# Altium footprint library DSO.PcbLib: 86 footprints (part 1 of 6)
Each footprint in its own frame and in the unit in brackets; x right, y up, seen from the top. Pads: shape width x height; smd on the part's side, far side on the other; paste and mask are expansions set on the pad; w line width, h text height; cw(c..) or ccw(c..) is an arc to the next point about the centre after c.
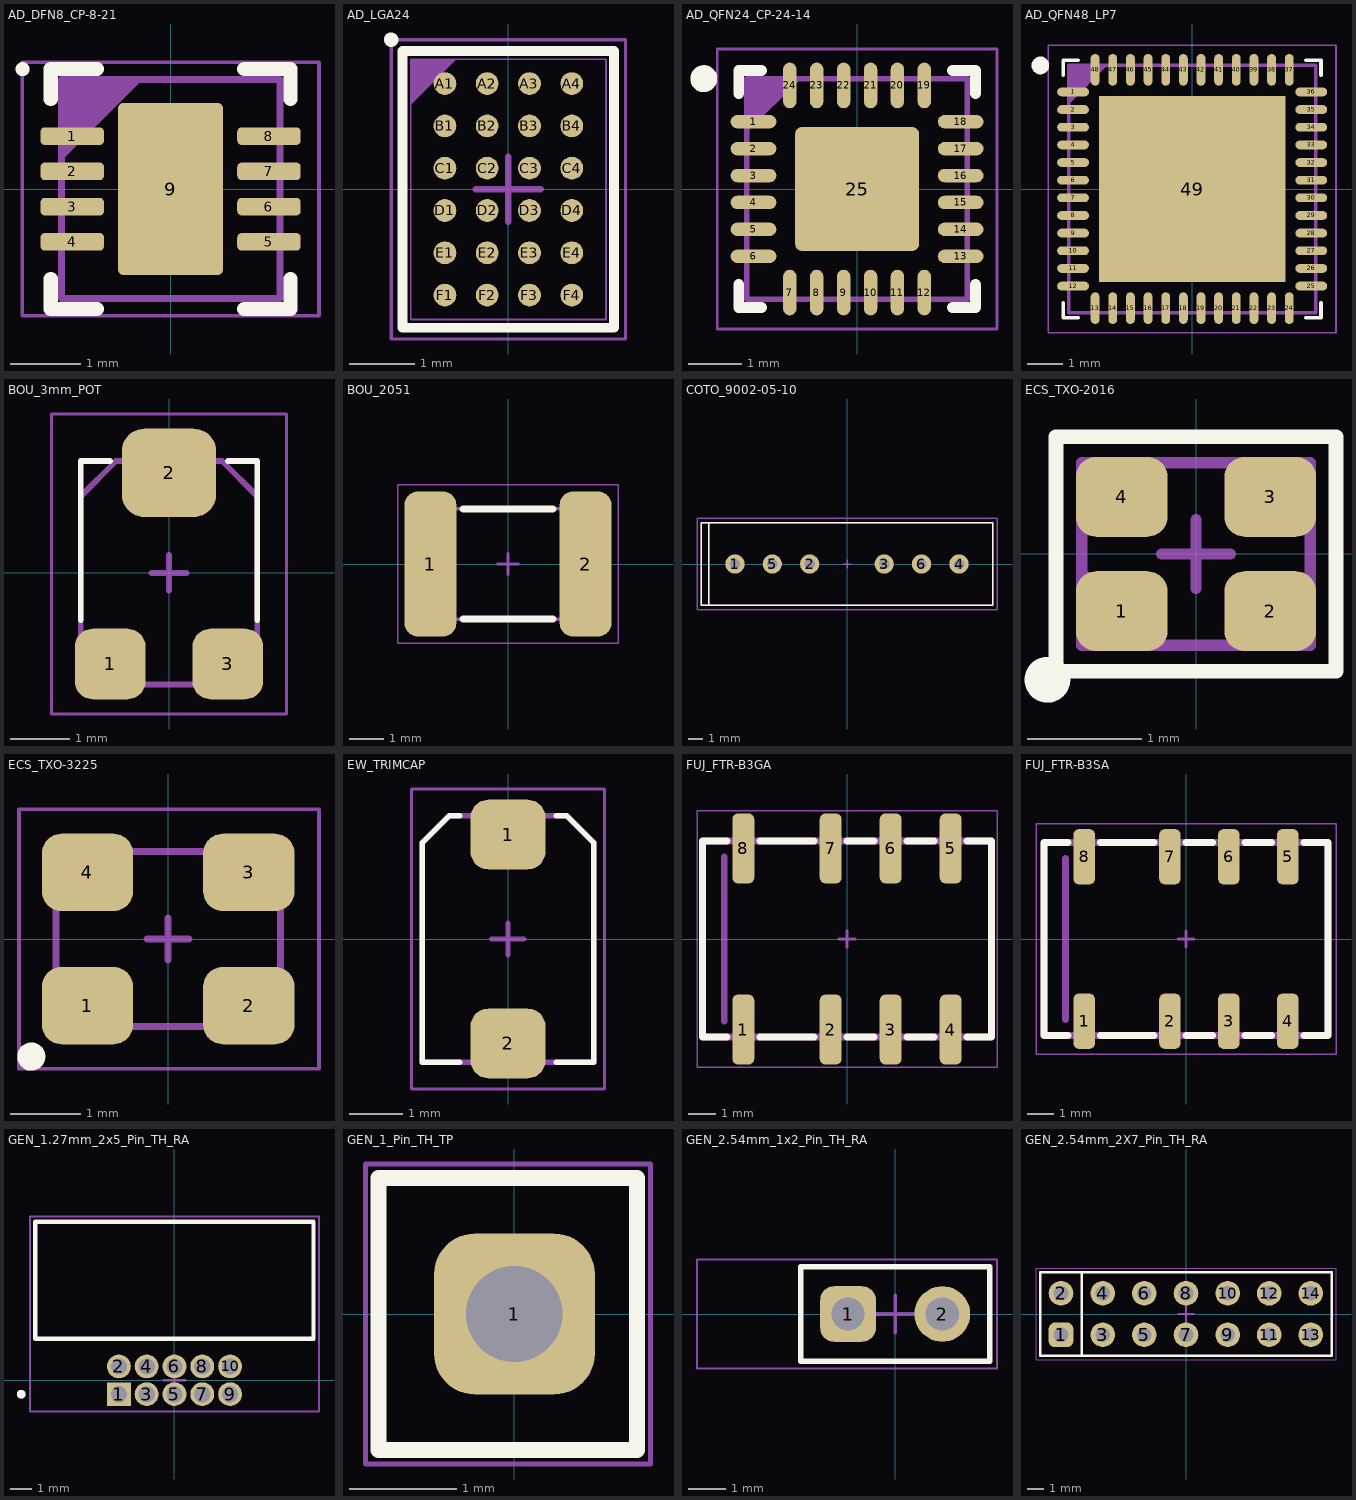
[diagram p0: the footprints below, top view; thin cyan lines are the x and y axes]

## AD_DFN8_CP-8-21 [mm] "SON, 8-Leads, Body 3.00x3.00mm, Pitch 0.50mm, Thermal Pad 2.44x1.49mm, IPC Medium Density"
height 0.8
pads (9):
  rrect50% 0.9x0.25 smd: 1(-1.395,0.75) 2(-1.395,0.25) 3(-1.395,-0.25) 4(-1.395,-0.75) 5(1.395,-0.75) 6(1.395,-0.25) 7(1.395,0.25) 8(1.395,0.75)
  rrect10% 1.49x2.44 smd paste-0.745: 9(0,0)
Top Overlay:
  circle w0.1: c-2.1,1.7 r0.05
  lines w0.2: -1.7,-1.275 -1.7,-1.7 -1.045,-1.7 ; -1.7,1.275 -1.7,1.7 -1.045,1.7 ; 1.045,-1.7 1.7,-1.7 1.7,-1.275 ; 1.045,1.7 1.7,1.7 1.7,1.275
Top Paste:
  rectangle: -0.7,-1.2 0.7,-0.1
  rectangle: -0.7,0.1 0.7,1.2
Top Courtyard:
  lines w0.05: -2.105,-1.8 2.105,-1.8 2.105,1.8 -2.105,1.8 -2.105,-1.8
Top Assembly:
  region: -1.55,0.4 -0.4,1.55 -1.55,1.55
  lines w0.1: -1.55,-1.55 1.55,-1.55 1.55,1.55 -1.55,1.55 -1.55,-1.55
  text ".Designator" at 0.209,-2.477 h1
Top Component Center:
  lines w0.1: -0.5,0 0.5,0 ; 0,-0.5 0,0.5
3D body "AD_DFN8_CP-8-21.step": height 0.8, standoff 0, extent -1.551,-1.55 1.551,1.55

## AD_LGA24 [mm]
pads (24):
  round 0.35 smd paste+0 mask+0: A1(-0.975,1.625) A2(-0.325,1.625) A3(0.325,1.625) A4(0.975,1.625) B1(-0.975,0.975) B2(-0.325,0.975) B3(0.325,0.975) B4(0.975,0.975) C1(-0.975,0.325) C2(-0.325,0.325) C3(0.325,0.325) C4(0.975,0.325) D1(-0.975,-0.325) D2(-0.325,-0.325) D3(0.325,-0.325) D4(0.975,-0.325) E1(-0.975,-0.975) E2(-0.325,-0.975) E3(0.325,-0.975) E4(0.975,-0.975) F1(-0.975,-1.625) F2(-0.325,-1.625) F3(0.325,-1.625) F4(0.975,-1.625)
Top Overlay:
  circle w0.2: c-1.8,2.3 r0.01
  lines w0.152: -1.627,-2.127 -1.627,2.127 1.627,2.127 1.627,-2.127 -1.627,-2.127
Top Courtyard:
  lines w0.05: -1.8,-2.3 1.8,-2.3 1.8,2.3 -1.8,2.3 -1.8,-2.3
Top Assembly:
  region: -1.5,1.3 -0.8,2 -1.5,2
  lines w0.025: -1.5,-2 -1.5,2 1.5,2 1.5,-2 -1.5,-2
  text ".Designator" at 0.209,-2.477 h1
Top Component Center:
  lines w0.1: -0.5,0 0.5,0 ; 0,-0.5 0,0.5
3D body: height 1.28, standoff 0, extent -1.513,-2.013 1.513,2.013

## AD_QFN24_CP-24-14 [mm] "QFN, 24-Leads, Body 4.00x4.00mm, Pitch 0.50mm, Thermal Pad 2.30x2.30mm, IPC Medium Density"
height 0.8
pads (25):
  oval 0.85x0.25 smd: 1(-1.925,1.25) 2(-1.925,0.75) 3(-1.925,0.25) 4(-1.925,-0.25) 5(-1.925,-0.75) 6(-1.925,-1.25) 13(1.925,-1.25) 14(1.925,-0.75) 15(1.925,-0.25) 16(1.925,0.25) 17(1.925,0.75) 18(1.925,1.25)
  oval 0.25x0.85 smd: 7(-1.25,-1.925) 8(-0.75,-1.925) 9(-0.25,-1.925) 10(0.25,-1.925) 11(0.75,-1.925) 12(1.25,-1.925) 19(1.25,1.925) 20(0.75,1.925) 21(0.25,1.925) 22(-0.25,1.925) 23(-0.75,1.925) 24(-1.25,1.925)
  rrect10% 2.3x2.3 smd paste-2.3: 25(0,0)
Top Overlay:
  circle w0.25: c-2.85,2.05 r0.125
  lines w0.2: -2.2,-1.775 -2.2,-2.2 -1.775,-2.2 ; -2.2,1.775 -2.2,2.2 -1.775,2.2 ; 1.775,-2.2 2.2,-2.2 2.2,-1.775 ; 1.775,2.2 2.2,2.2 2.2,1.775
Top Paste:
  rectangle: 0.1,-1.1 1.1,-0.1
  rectangle: -1.1,-1.1 -0.1,-0.1
  rectangle: -1.1,0.1 -0.1,1.1
  rectangle: 0.1,0.1 1.1,1.1
Top Courtyard:
  lines w0.05: -2.6,-2.6 -2.6,2.6 2.6,2.6 2.6,-2.6 -2.6,-2.6
Top Assembly:
  region: -2.05,1.05 -1.05,2.05 -2.05,2.05
  lines w0.1: -2.05,-2.05 2.05,-2.05 2.05,2.05 -2.05,2.05 -2.05,-2.05
  text ".Designator" at -2.477,-0.209 h1
Top Component Center:
  lines w0.1: -0.5,0 0.5,0 ; 0,-0.5 0,0.5
3D body "AD_QFN24_CP-24-14_1.step": height 0.8, standoff 0, extent -2.07,-2.07 2.07,2.07

## AD_QFN48_LP7 [mm] "QFN, 48-Leads, Body 7.00x7.00mm, Pitch 0.50mm, Thermal Pad 5.28x5.28mm, IPC Medium Density"
height 1
pads (49):
  oval 0.9x0.25 smd: 1(-3.375,2.75) 2(-3.375,2.25) 3(-3.375,1.75) 4(-3.375,1.25) 5(-3.375,0.75) 6(-3.375,0.25) 7(-3.375,-0.25) 8(-3.375,-0.75) 9(-3.375,-1.25) 10(-3.375,-1.75) 11(-3.375,-2.25) 12(-3.375,-2.75) 25(3.375,-2.75) 26(3.375,-2.25) 27(3.375,-1.75) 28(3.375,-1.25) 29(3.375,-0.75) 30(3.375,-0.25) 31(3.375,0.25) 32(3.375,0.75) 33(3.375,1.25) 34(3.375,1.75) 35(3.375,2.25) 36(3.375,2.75)
  oval 0.25x0.9 smd: 13(-2.75,-3.375) 14(-2.25,-3.375) 15(-1.75,-3.375) 16(-1.25,-3.375) 17(-0.75,-3.375) 18(-0.25,-3.375) 19(0.25,-3.375) 20(0.75,-3.375) 21(1.25,-3.375) 22(1.75,-3.375) 23(2.25,-3.375) 24(2.75,-3.375) 37(2.75,3.375) 38(2.25,3.375) 39(1.75,3.375) 40(1.25,3.375) 41(0.75,3.375) 42(0.25,3.375) 43(-0.25,3.375) 44(-0.75,3.375) 45(-1.25,3.375) 46(-1.75,3.375) 47(-2.25,3.375) 48(-2.75,3.375)
  rect 5.28x5.28 smd paste-5.28: 49(0,0)
Top Overlay:
  circle w0.25: c-4.3,3.5 r0.125
  lines w0.1: -3.65,-3.225 -3.65,-3.65 -3.225,-3.65 ; -3.65,3.225 -3.65,3.65 -3.225,3.65 ; 3.225,-3.65 3.65,-3.65 3.65,-3.225 ; 3.225,3.65 3.65,3.65 3.65,3.225
Top Paste:
  region: 2.575,-1.025 1.025,-1.025 1.025,-2.575 2.575,-2.575
  region: 0.775,-1.025 -0.775,-1.025 -0.775,-2.575 0.775,-2.575
  region: -1.025,-1.025 -2.575,-1.025 -2.575,-2.575 -1.025,-2.575
  region: -1.025,0.775 -2.575,0.775 -2.575,-0.775 -1.025,-0.775
  region: 0.775,0.775 -0.775,0.775 -0.775,-0.775 0.775,-0.775
  region: 2.575,0.775 1.025,0.775 1.025,-0.775 2.575,-0.775
  region: 2.575,2.575 1.025,2.575 1.025,1.025 2.575,1.025
  region: 0.775,2.575 -0.775,2.575 -0.775,1.025 0.775,1.025
  region: -1.025,2.575 -2.575,2.575 -2.575,1.025 -1.025,1.025
Top Courtyard:
  lines w0.05: -4.075,-4.075 -4.075,4.075 4.075,4.075 4.075,-4.075 -4.075,-4.075
Top Assembly:
  region: -3.5,2.4 -2.4,3.5 -3.5,3.5
  lines w0.1: -3.5,-3.5 3.5,-3.5 3.5,3.5 -3.5,3.5 -3.5,-3.5
  text ".Designator" at -2.477,-0.209 h1
Top Component Center:
  lines w0.1: -0.5,0 0.5,0 ; 0,-0.5 0,0.5
3D body "AD_QFN48_LP7.step": height 1, standoff 0, extent -3.501,-3.501 3.501,3.501

## BOU_3mm_POT [mm]
height 1.2
pads (3):
  rrect50% 1.2x1.2 smd: 1(-1,-1.55) 3(1,-1.55)
  rrect50% 1.6x1.5 smd: 2(0,1.7)
Top Overlay:
  lines w0.1: -1.5,-0.8 -1.5,1.9 -1,1.9 ; 1,1.9 1.5,1.9 1.5,-0.8
Top Courtyard:
  lines w0.05: -2,-2.4 -2,2.7 2,2.7 2,-2.4 -2,-2.4
Top Assembly:
  lines w0.1: -1.5,-1.9 1.5,-1.9 1.5,1.3 0.9,1.9 -0.9,1.9 -1.5,1.3 -1.5,-1.9
  text ".Designator" at 0.209,-2.477 h1
Top Component Center:
  lines w0.1: -0.3,0 0.3,0 ; 0,-0.3 0,0.3
3D body "TC-33X-2.stp": height 1.13, standoff -0.02, extent -1.8,-1.763 1.8,2.2

## BOU_2051 [mm]
height 3
pads (2):
  rrect50% 1.5x4.2 smd: 1(-2.25,0) 2(2.25,0)
Top Overlay:
  lines w0.2: -1.3,-1.6 1.3,-1.6 ; -1.3,1.6 1.3,1.6
Top Courtyard:
  lines w0.05: -3.2,-2.3 3.2,-2.3 3.2,2.3 -3.2,2.3 -3.2,-2.3
Top Assembly:
  lines w0.1: -2.3,-1.6 -2.3,1.6 2.3,1.6 2.3,-1.6 -2.3,-1.6
  text ".Designator" at -2.477,-0.209 h1
Top Component Center:
  lines w0.1: -0.3,0 0.3,0 ; 0,-0.3 0,0.3
3D body "2051-xx-sm.stp": height 2.7, standoff 0, extent -2.25,-1.6 2.25,1.6

## COTO_9002-05-10 [mm]
pads (6):
  round 1.31 hole 0.71: 1(-7.619,0) 2(-2.539,0) 3(2.528,0) 4(7.619,0) 5(-5.079,0) 6(5.064,0)
Top Overlay:
  lines w0.1: -9.398,-2.794 -9.398,2.794 ; 9.896,2.794 -9.906,2.794 -9.906,-2.794 9.896,-2.794 9.903,-2.787 9.903,2.801
Top Courtyard:
  lines w0.1: -10.2,-3.1 -10.2,3.1 10.2,3.1 10.2,-3.1 -10.2,-3.1
Top Assembly:
  lines w0.1: -9.398,-2.794 -9.398,2.794 ; 9.896,2.794 -9.906,2.794 -9.906,-2.794 9.896,-2.794 9.903,-2.787 9.903,2.801
  text ".Designator" at -2.477,-0.209 h1
Top Component Center:
  lines w0.1: -0.3,0 0.3,0 ; 0,-0.3 0,0.3
3D body "9002-A.stp": height 7.64, standoff -3.15, extent -9.5,-2.542 9.5,2.488

## ECS_TXO-2016 [mm]
height 0.8
pads (4):
  rrect50% 0.8x0.7 smd: 1(-0.65,-0.5) 2(0.65,-0.5) 3(0.65,0.5) 4(-0.65,0.5)
Top Overlay:
  circle w0.2: c-1.3,-1.1 r0.1
  lines w0.127: -1.225,-1.025 1.225,-1.025 1.225,1.025 -1.225,1.025 -1.225,-1.025
Top Courtyard:
  lines w0.05: -1.2,-1 1.2,-1 1.2,1 -1.2,1 -1.2,-1
Top Assembly:
  region: -0.3,-0.8 -1,-0.1 -1,-0.8
  lines w0.1: -1,-0.8 1,-0.8 1,0.8 -1,0.8 -1,-0.8
  text ".Designator" at -2.477,-0.209 h1
Top Component Center:
  lines w0.1: -0.3,0 0.3,0 ; 0,-0.3 0,0.3
3D body: height 0.8, standoff 0, extent -1.05,-0.85 1.05,0.85

## ECS_TXO-3225 [mm]
height 0.8
pads (4):
  rrect50% 1.3x1.1 smd: 1(-1.15,-0.95) 2(1.15,-0.95) 3(1.15,0.95) 4(-1.15,0.95)
Top Overlay:
  circle w0.2: c-1.95,-1.675 r0.1
Top Courtyard:
  lines w0.05: -2.125,-1.85 2.15,-1.85 2.15,1.85 -2.125,1.85 -2.125,-1.85
Top Assembly:
  region: -0.9,-1.25 -1.6,-0.55 -1.6,-1.25
  lines w0.1: -1.6,-1.25 -1.6,1.25 1.6,1.25 1.6,-1.25 -1.6,-1.25
  text ".Designator" at -2.477,-0.209 h1
Top Component Center:
  lines w0.1: -0.3,0 0.3,0 ; 0,-0.3 0,0.3
3D body: height 0.8, standoff 0, extent -1.6,-1.25 1.6,1.25

## EW_TRIMCAP [mm]
height 1.5
pads (2):
  rrect50% 1.4x1.3 smd: 1(0,1.95) 2(0,-1.95)
Top Overlay:
  lines w0.1: -0.9,-2.3 -1.6,-2.3 -1.6,1.6 -1.6,1.8 -1.1,2.3 -0.9,2.3 ; 0.9,-2.3 1.6,-2.3 1.6,1.8 1.1,2.3 0.9,2.3
Top Courtyard:
  lines w0.05: -1.8,-2.8 -1.8,2.8 1.8,2.8 1.8,-2.8 -1.8,-2.8
Top Assembly:
  lines w0.1: -1.6,-2.3 -1.6,1.6 -1.6,1.8 -1.1,2.3 0.9,2.3 1.1,2.3 1.6,1.8 1.6,-2.3 0.9,-2.3 -1.6,-2.3
  text ".Designator" at 0.209,-2.477 h1
Top Component Center:
  lines w0.1: -0.3,0 0.3,0 ; 0,-0.3 0,0.3
3D body: height 1.5, standoff 0, extent -1.6,-2.3 1.6,2.3

## FUJ_FTR-B3GA [mm]
height 5.45
pads (8):
  rrect50% 0.8x2.56 smd: 1(-3.8,-3.32) 2(-0.6,-3.32) 3(1.6,-3.32) 4(3.8,-3.32) 5(3.8,3.32) 6(1.6,3.32) 7(-0.6,3.32) 8(-3.8,3.32)
Top Overlay:
  lines w0.254: -4.4,-3.6 -5.3,-3.6 -5.3,3.6 -4.4,3.6 ; -3.2,-3.6 -1.2,-3.6 ; -3.2,3.6 -1.2,3.6 ; 0,-3.6 1,-3.6 ; 0,3.6 1,3.6 ; 2.2,-3.6 3.2,-3.6 ; 2.2,3.6 3.2,3.6 ; 4.4,-3.6 5.3,-3.6 5.3,3.6 4.4,3.6
Top Courtyard:
  lines w0.05: -5.5,-4.7 -5.5,4.7 5.5,4.7 5.5,-4.7 -5.5,-4.7
Top Assembly:
  lines w0.254: -4.5,-3 -4.5,3 ; -5.3,-3.6 -5.3,3.6 -3.2,3.6 0,3.6 2.2,3.6 4.4,3.6 5.3,3.6 5.3,-3.6 4.4,-3.6 2.2,-3.6 0,-3.6 -3.2,-3.6 -5.3,-3.6
  text ".Designator" at -2.477,-0.209 h1
Top Component Center:
  lines w0.1: -0.3,0 0.3,0 ; 0,-0.3 0,0.3
3D body: height 5.45, standoff 0, extent -5.427,-3.727 5.427,3.727

## FUJ_FTR-B3SA [mm]
height 5.75
pads (8):
  rrect50% 0.8x2.06 smd: 1(-3.8,-3.07) 2(-0.6,-3.07) 3(1.6,-3.07) 4(3.8,-3.07) 5(3.8,3.07) 6(1.6,3.07) 7(-0.6,3.07) 8(-3.8,3.07)
Top Overlay:
  lines w0.254: -4.4,-3.6 -5.3,-3.6 -5.3,3.6 -4.4,3.6 ; -3.2,-3.6 -1.2,-3.6 ; -3.2,3.6 -1.2,3.6 ; 0,-3.6 1,-3.6 ; 0,3.6 1,3.6 ; 2.2,-3.6 3.2,-3.6 ; 2.2,3.6 3.2,3.6 ; 4.4,-3.6 5.3,-3.6 5.3,3.6 4.4,3.6
Top Courtyard:
  lines w0.05: -5.6,-4.3 5.6,-4.3 5.6,4.3 -5.6,4.3 -5.6,-4.3
Top Assembly:
  lines w0.254: -4.5,-3 -4.5,3 ; -5.3,-3.6 -3.2,-3.6 0,-3.6 2.2,-3.6 4.4,-3.6 5.3,-3.6 5.3,3.6 3.2,3.6 1,3.6 -1.2,3.6 -4.4,3.6 -5.3,3.6 -5.3,-3.6
  text ".Designator" at -2.477,-0.209 h1
Top Component Center:
  lines w0.1: -0.3,0 0.3,0 ; 0,-0.3 0,0.3
3D body: height 5.45, standoff 0, extent -5.427,-3.727 5.427,3.727

## GEN_1.27mm_2x5_Pin_TH_RA [mm]
pads (10):
  rect 1.09x1.09 hole 0.74: 1(-2.54,-0.635)
  round 1.09 hole 0.74: 2(-2.54,0.635) 3(-1.27,-0.635) 4(-1.27,0.635) 5(0,-0.635) 6(0,0.635) 7(1.27,-0.635) 8(1.27,0.635) 9(2.54,-0.635) 10(2.54,0.635)
Top Overlay:
  circle w0.2: c-7,-0.635 r0.1
  lines w0.2: -6.35,1.905 -6.35,7.235 6.35,7.235 6.35,1.905 -6.35,1.905
Top Courtyard:
  lines w0.05: -6.6,-1.43 6.6,-1.43 6.6,7.485 -6.6,7.485 -6.6,-1.43
Top Assembly:
  lines w0.1: -6.6,-1.425 6.6,-1.425 6.6,7.475 -6.6,7.475 -6.6,-1.425
  text ".Designator" at -2.477,-0.209 h1
Top Component Center:
  lines w0.1: -0.5,0 0.5,0 ; 0,-0.5 0,0.5
Top 3D Body (Mech13):
  circle w0.2: c-7,-0.635 r0.1
  lines w0.1: -6.35,1.905 -6.35,7.235 ; -6.35,1.905 6.35,1.905 ; -6.35,1.905 -6.35,7.235 ; -6.35,7.235 6.35,7.235 ; -6.35,7.235 6.35,7.235 ; 6.35,1.905 6.35,7.235 ; 6.35,1.905 6.35,7.235
3D body "SHF-105-01-L-D-RA.stp": height 5.6, standoff -2.15, extent -6.35,-0.843 6.35,7.234

## GEN_1_Pin_TH_TP [mm]
height 8.54
pads (1):
  rrect50% 1.5x1.5 hole 0.9: 1(0,0)
Top Overlay:
  lines w0.15: -1.27,-1.27 1.143,-1.27 1.143,1.27 -1.27,1.27 -1.27,-1.27
Top Courtyard:
  lines w0.05: -1.39,-1.4 1.27,-1.4 1.27,1.4 -1.39,1.4 -1.39,-1.4
Top Assembly:
  lines w0.1: -1.27,-1.27 -1.27,1.27 1.143,1.27 1.143,-1.27 -1.27,-1.27
  text ".Designator" at -2.477,-0.209 h1
Top Component Center:
  lines w0.1: -0.5,0 0.5,0 ; 0,-0.5 0,0.5

## GEN_2.54mm_1x2_Pin_TH_RA [mm]
height 8.54
pads (2):
  rrect50% 1.5x1.5 hole 0.9: 1(-1.27,0)
  round 1.5 hole 0.9: 2(1.27,0)
Top Overlay:
  lines w0.15: -2.54,-1.27 -2.54,1.27 2.54,1.27 2.54,-1.27 -2.54,-1.27
Top Courtyard:
  lines w0.05: -5.334,-1.47 2.74,-1.47 2.74,1.47 -5.334,1.47 -5.334,-1.47
Top Assembly:
  lines w0.1: -2.54,-1.27 -2.54,1.27 2.54,1.27 2.54,-1.27 -2.54,-1.27
  text ".Designator" at -2.477,-0.209 h1
Top Component Center:
  lines w0.1: -0.5,0 0.5,0 ; 0,-0.5 0,0.5
3D body "TSW-101-08-F-D-RA.stp": height 5.54, standoff -2.31, extent -11.182,-1.27 1.582,1.27

## GEN_2.54mm_2X7_Pin_TH_RA [mm]
height 8.54
pads (14):
  rrect50% 1.5x1.5 hole 0.9: 1(-7.62,-1.27)
  round 1.5 hole 0.9: 2(-7.62,1.27) 3(-5.08,-1.27) 4(-5.08,1.27) 5(-2.54,-1.27) 6(-2.54,1.27) 7(0,-1.27) 8(0,1.27) 9(2.54,-1.27) 10(2.54,1.27) 11(5.068,-1.27) 12(5.068,1.258) 13(7.608,-1.27) 14(7.608,1.258)
Top Overlay:
  lines w0.15: -6.35,-2.54 -6.35,2.54 ; -8.89,-2.54 -8.89,2.54 8.89,2.54 8.89,-2.54 -8.89,-2.54
Top Courtyard:
  lines w0.05: -9.144,-2.794 9.144,-2.794 9.144,2.794 -9.144,2.794 -9.144,-2.794
Top Assembly:
  lines w0.1: -6.35,-2.54 -6.35,2.54 ; -8.89,-2.54 -8.89,2.54 8.89,2.54 8.89,-2.54 -8.89,-2.54
  text ".Designator" at -2.477,-0.209 h1
Top Component Center:
  lines w0.1: -0.5,0 0.5,0 ; 0,-0.5 0,0.5
3D body "SFH11-xxPC-D07-RA-BK.STEP": height 8.1, standoff -1.7, extent -11.35,-1.44 11.35,11.4